# Altium schematic symbol library SCHLIB.SchLib: 2608 symbols (part 2 of 20) (continued)
## CON-3POS-2.5MM-RA (continued)
CONN HEADER 3POS 2.5MM R/A TIN; Manufacturer: Molex; Manufacturer Part Number: 0022057035; Gender: Male; Contact Resistance: 20mR; Number of Positions: 3; Max Voltage Rating (DC): 250V; Connector Type: Male Pin; Washability: OK; Supplier 1: Digi-Key; Stock 1: 10713; Pricing 1: 1=0.56, 10=0.527, 100=0.4037, 500=0.351, 1000=0.28958, 5000=0.25448, 10000=0.23693 (USD); Colour: Natural; Contact Plating: Copper,Tin; Contact Material: Brass; Housing Colour: Natural; Housing Material: Nylon; Min Operating Temperature: -40°C; Max Operating Temperature: 105°C; Packaging: Bulk; Number of Rows: 1; Termination: Solder; Number of Contacts: 3; Max Voltage Rating (AC): 250V; Length: 9.9mm; Depth: 7.9mm; Contact Mating Length: 0.138inch; ComponentLink1URL: http://www.molex.com/webdocs/datasheets/pdf/en-us/0022057035_PCB_HEADERS.pdf; ComponentLink1Description: http://www.molex.com/webdocs/datasheets/pdf/en-us/0022057035_PCB_HEADERS.pdf; ComponentLink2URL: https://www.molex.com/pdm_docs/sd/022057035_sd.pdf; ComponentLink2Description: https://www.molex.com/pdm_docs/sd/022057035_sd.pdf; Supplier Part Number 1: WM18901-ND
pins: 1, 2, 3

## CON-3POS-2.5MM-SOW3
designator J?, comment 2,5MSF03
Lumberg 2.5 MSF Series, 2.5mm Pitch 3 Way 1 Row Straight PCB Header, Solder Termination, 5A; Voltage Rating: 160V; Number of Contacts: 3; Gender: Male; Pitch: 5mm; Washability: OK; Supplier 1: TME; Manufacturer: Lumberg; Manufacturer Part Number: 2,5MSF03; Stock 1: 554; Pricing 1: 3=0.25440, 25=0.17800, 100=0.15820, 250=0.13850 (USD); RoHS: Yes; Case/Package: Module; Contact Material: Brass,CuZn; Contact Plating: Tin; Color: Black; Housing Material: Polyamide; Min Operating Temperature: -40°C; Max Operating Temperature: 120°C; Number of Rows: 1; Current Rating: 5A; Packaging: Bulk; Max Current Rating: 5A; Termination: Solder; Max Voltage Rating (AC): 160V; Orientation: Straight; Length: 12.2mm; Height: 22.5mm; Width: 7.5mm; Depth: 7.5mm; ComponentLink1URL: https://datasheet.ciiva.com/11754/0900766b80fbfb97-11754066.pdf?src-supplier=RSComponents; ComponentLink1Description: https://datasheet.ciiva.com/11754/0900766b80fbfb97-11754066.pdf?src-supplier=RSComponents; ComponentLink2URL: https://datasheet.ciiva.com/29195/732809-da-01-ml-stiftleiste-2-5-msf03-de-en-fr-29195855.pdf?src-supplier=Conrad; ComponentLink2Description: https://datasheet.ciiva.com/29195/732809-da-01-ml-stiftleiste-2-5-msf03-de-en-fr-29195855.pdf?src-supplier=Conrad; Supplier Part Number 1: 2.5MSF03
footprint 2.5 MSF 03
pins: 1, 2, 3

## CON-3POS-2.5MM-VERT
designator J?  Orientation: VRT  Mount: TH  Pitch: 2.5mm  (hidden comment: *)
CONN HEADER 3POS 2.5MM VERT TIN; Manufacturer: Molex; Number of Contacts: 3; Gender: Male; Current Rating: 3A; Contact Resistance: 20mR; Insulation Resistance: 1GR; Voltage Rating: 250V; Shrouded: Yes (With); Test Voltage: 1kV; Glow Wire Compliant: Non-compliant; Washability: OK; Supplier 1: Digi-Key; Manufacturer Part Number: 22-03-5035; Stock 1: 24555; Pricing 1: 1=0.53, 10=0.497, 100=0.3811, 500=0.3314, 1000=0.27341, 5000=0.24027, 10000=0.2237 (USD); Contact Plating: Copper,Tin; Contact Material: Brass,Tin; Housing Material: Nylon; Min Operating Temperature: -40°C; Max Operating Temperature: 105°C; Number of Rows: 1; Packaging: Bulk; Termination: Solder; Number of Positions: 3; Voltage Rating (AC): 250V; Number of Poles: 3; Package Quantity: 25000; Contact Gender: Male; Working Voltage: 250V; Voltage Rating (DC): 250V; Number of Circuits: 3; Radiation Hardening: No; Lead Free: Lead Free; REACH SVHC: Unknown; Flammability Rating: UL94 V-0; ComponentLink1URL: http://uk.rs-online.com/webdocs/13c2/0900766b813c2d9b.pdf; ComponentLink1Description: http://uk.rs-online.com/webdocs/13c2/0900766b813c2d9b.pdf; ComponentLink2URL: http://www.farnell.com/datasheets/1762354.pdf; ComponentLink2Description: http://www.farnell.com/datasheets/1762354.pdf; ComponentLink3URL: http://www.mouser.com/ds/2/276/0022035035_PCB_HEADERS-158316.pdf; ComponentLink3Description: http://www.mouser.com/ds/2/276/0022035035_PCB_HEADERS-158316.pdf; Supplier Part Number 1: WM18887-ND
footprint CON-3POS 2.5MM VERT
pins: 1 GND_IN, 2, 3

## CON-3POS-2.54MM-HEADER
designator J?  Pitch: 2.54mm  Mount: TH  (hidden comment: *)
CONN HEADER 3POS 2.54MM; Manufacturer: Wurth Electronics; Manufacturer Part Number: 61300311121; Number of Positions: 3; Gender: Male; Connector Type: Male Pin; Washability: OK; Supplier 1: Digi-Key; Stock 1: 178007; Pricing 1: 1=0.13, 10=0.106, 25=0.088, 50=0.074, 100=0.067, 1000=0.061 (USD); Contact Plating: Gold; Contact Material: Copper; Colour: Black; Number of Rows: 1; Packaging: Bulk; Termination: Solder; Number of Contacts: 3; Contact Mating Length: 0.236inch; REACH SVHC: Unknown; Lead Free: Lead Free; Supplier Part Number 1: 732-5316-ND
pins: 1 GND_IN, 2, 3

## CON-3POS-2MM-SMD
designator J?, comment 2MM
CONN HEADER SMD 3POS 2MM; Manufacturer: JST; Manufacturer Part Number: B3B-PH-SM4-TB(LF)(SN); Number of Positions: 3; Connector Type: Male Pin; Contact Resistance: 20mR; Current Rating: 2A; Voltage Rating (AC): 100V; Insulation Resistance: 1GR; Gender: Male; Washability: OK; Supplier 1: Digi-Key; Supplier Part Number 1: 455-1735-2-ND; Stock 1: 36000; Pricing 1: 1000=0.29721, 2000=0.28821, 3000=0.27019, 5000=0.26118, 10000=0.24317, 25000=0.23417 (USD); RoHS: Yes; Mount: Surface Mount; Color: Natural,White; Contact Plating: Tin,Copper; Contact Material: Copper Alloy,Tin,Bronze,Brass; Housing Color: Beige; Housing Material: Polyamide; Min Operating Temperature: -25°C; Max Operating Temperature: 85°C; Number of Rows: 1; Packaging: Tape and Reel; Termination: Solder; Max Current Rating: 2A; Number of Poles: 3; Voltage Rating: 100V; Fastening Type: Detent; Max Voltage Rating (AC): 100V; Number of Contacts: 3; Max Voltage Rating (DC): 100V; Working Voltage: 100V; Orientation: Straight; Length: 9.95mm; Height: 9.4mm; Pitch: 2mm; Lead Pitch: 2mm; Width: 5.5mm; Contact Mating Length: 0.13inch; Depth: 5mm; Lead Free: Lead Free; REACH SVHC: No SVHC; Flammability Rating: UL94 V-0; ComponentLink1URL: https://datasheet.ciiva.com/11747/0900766b80ddea81-11747684.pdf?src-supplier=RSComponents; ComponentLink1Description: https://datasheet.ciiva.com/11747/0900766b80ddea81-11747684.pdf?src-supplier=RSComponents
footprint CON-3POS-2MM-SMD
pins: 1 GND_IN, 2, 3

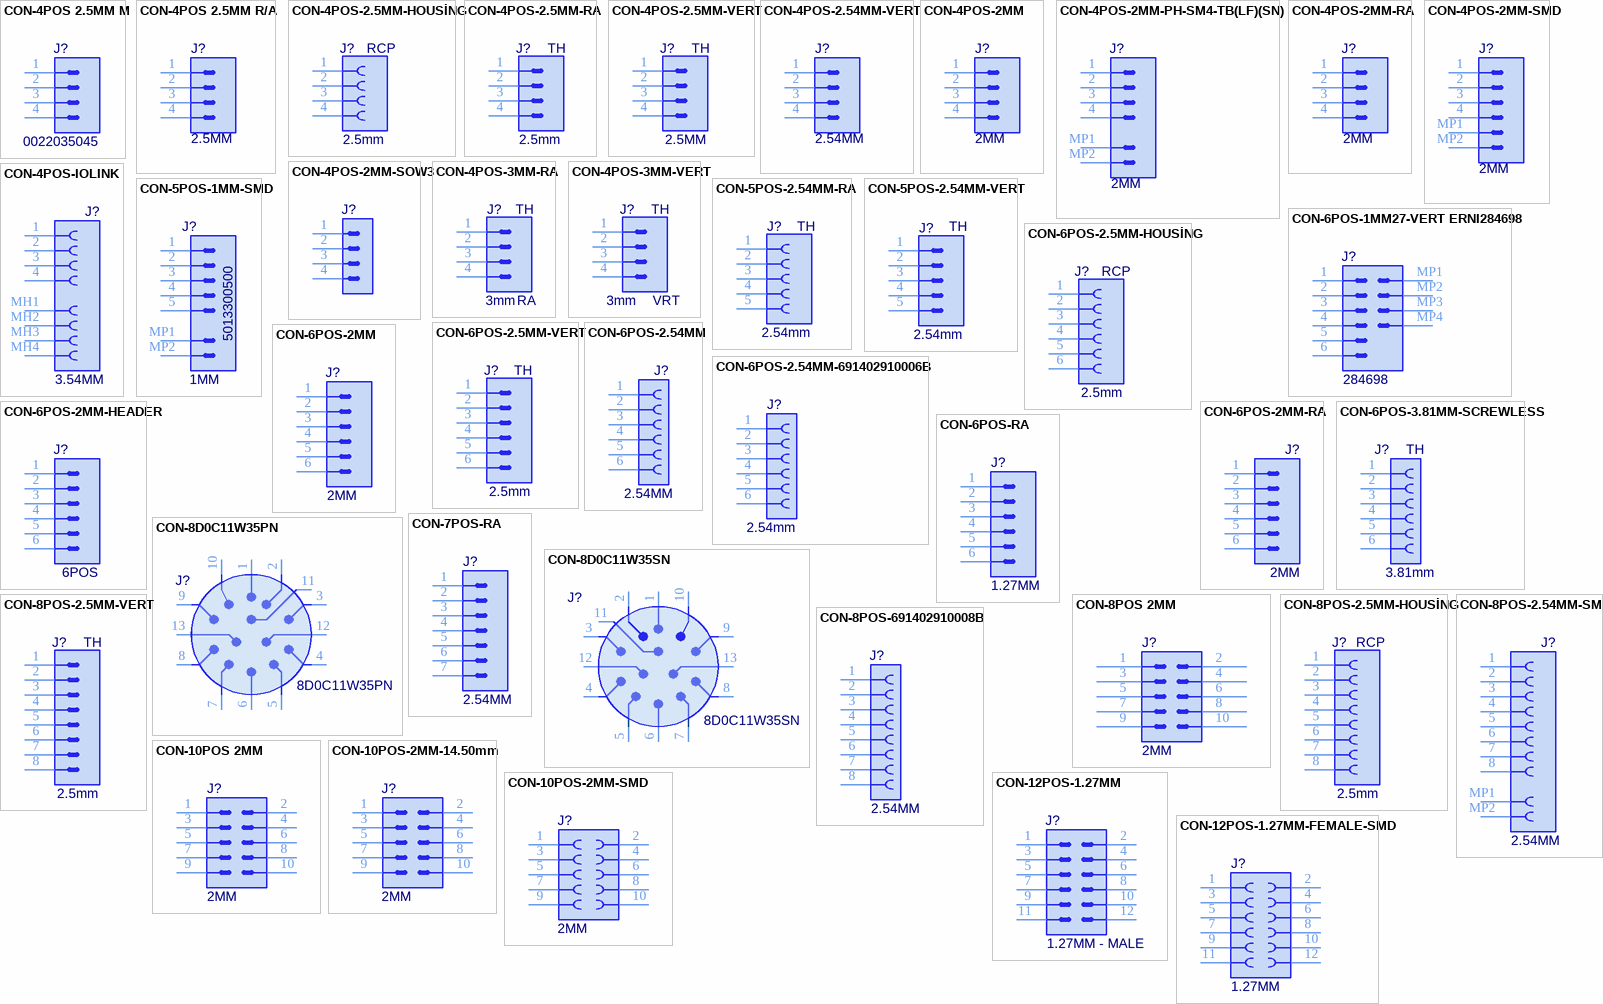
[diagram p6: symbols CON-4POS 2.5MM M to CON-12POS-1.27MM-FEMALE-SMD]

## CON-4POS 2.5MM M
designator J?, comment 0022035045
CONN HEADER VERT 4POS 2.5MM; Manufacturer: Molex; Number of Positions: 4; Gender: Male; Current Rating: 3A; Voltage Rating: 250V; Contact Resistance: 20mR; Insulation Resistance: 1GR; Test Voltage: 1kV; Washability: OK; Supplier 1: Digi-Key; Manufacturer Part Number: 22-03-5045; Stock 1: 28354; Pricing 1: 1=0,66000, 10=0,61400, 100=0,47100, 500=0,40960, 1000=0,33792, 5000=0,29696, 10000=0,27648 (USD); RoHS: Yes; Mount: Through Hole; Housing Material: Nylon; Contact Plating: Tin; Contact Material: Brass; Material: Nylon; Min Operating Temperature: -40°C; Max Operating Temperature: 105°C; Packaging: Bulk; Termination: Through Hole; Number of Rows: 1; Number of Contacts: 4; Package Quantity: 12000; Orientation: Straight; Contact Gender: Male; Number of Poles: 4; Voltage Rating (DC): 250V; Pitch: 2.5mm; Radiation Hardening: No; Lead Free: Lead Free; REACH SVHC: Unknown; Flammability Rating: UL94 V-0; ComponentLink1URL: https://datasheet.ciiva.com/30140/59000022035045-pcb-headers-30140706.pdf?src-supplier=Onlinecomponents.com; ComponentLink1Description: https://datasheet.ciiva.com/30140/59000022035045-pcb-headers-30140706.pdf?src-supplier=Onlinecomponents.com; ComponentLink2URL: https://datasheet.ciiva.com/11746/0900766b80da772c-11746677.pdf?src-supplier=RSComponents; ComponentLink2Description: https://datasheet.ciiva.com/11746/0900766b80da772c-11746677.pdf?src-supplier=RSComponents; ComponentLink3URL: https://datasheet.ciiva.com/5157/0022035045-pcb-headers-132183-5157848.pdf?src-supplier=Mouser; ComponentLink3Description: https://datasheet.ciiva.com/5157/0022035045-pcb-headers-132183-5157848.pdf?src-supplier=Mouser; ComponentLink4URL: https://datasheet.ciiva.com/27054/1930699-27054941.pdf?src-supplier=Jameco; ComponentLink4Description: https://datasheet.ciiva.com/27054/1930699-27054941.pdf?src-supplier=Jameco; ComponentLink5URL: https://datasheet.ciiva.com/25908/0022035045-pcb-headers-25908182.pdf?src-supplier=Avnet+Europe; ComponentLink5Description: https://datasheet.ciiva.com/25908/0022035045-pcb-headers-25908182.pdf?src-supplier=Avnet+Europe; ComponentLink6URL: https://datasheet.ciiva.com/9468/0022035045-pcb-headers-9468375.pdf?src-supplier=Avnet; ComponentLink6Description: https://datasheet.ciiva.com/9468/0022035045-pcb-headers-9468375.pdf?src-supplier=Avnet; ComponentLink7URL: https://datasheet.ciiva.com/7843/1864671-7843917.pdf?src-supplier=Element14; ComponentLink7Description: https://datasheet.ciiva.com/7843/1864671-7843917.pdf?src-supplier=Element14; Supplier Part Number 1: WM18888-ND
footprint CON-22035045
pins: 1 GND_IN, 2, 3, 4

## CON-4POS 2.5MM R/A
designator J?, comment 2.5MM
CONN HEADER R/A 4POS 2.5MM; Manufacturer 1: JST; Manufacturer Part Number 1: S4B-XH-A(LF)(SN); Current Rating: 3A; Voltage Rating: 250V; Contact Resistance: 20mR; Number of Positions: 4; Insulation Resistance: 1GR; Gender: Male; Connector Type: Male Pin; Wire/Cable Gauge: 22AWG; Washability: OK; Supplier 1: Digi-Key; Stock 1: 37754; Pricing 1: 1=0,27000, 10=0,25700, 100=0,17850, 500=0,15100, 1000=0,12355, 5000=0,10982, 10000=0,09953 (USD); RoHS: Yes; Mount: Through Hole; Color: Natural; Contact Material: Brass; Contact Plating: Tin; Housing Color: White; Housing Material: Polyamide; Min Operating Temperature: -25°C; Max Operating Temperature: 85°C; Package Quantity: 500; Number of Rows: 1; Packaging: Bulk; Voltage Rating (AC): 250V; Max Current Rating: 3A; Termination: Press-Fit; Number of Contacts: 4; Max Voltage Rating (AC): 250V; Orientation: Right Angle; Length: 12.4mm; Lead Pitch: 2.5mm; Pitch: 2.5mm; Depth: 11.5mm; REACH SVHC: No SVHC; Lead Free: Lead Free; ComponentLink1URL: https://datasheet.ciiva.com/726/exh-726400.pdf?src-supplier=Digi-Key; ComponentLink1Description: https://datasheet.ciiva.com/726/exh-726400.pdf?src-supplier=Digi-Key; ComponentLink2URL: https://datasheet.ciiva.com/26924/getdatasheetpartid-449045-26924078.pdf?src-supplier=Verical; ComponentLink2Description: https://datasheet.ciiva.com/26924/getdatasheetpartid-449045-26924078.pdf?src-supplier=Verical; ComponentLink3URL: https://datasheet.ciiva.com/8052/5448-8052236.pdf?src-supplier=Element14; ComponentLink3Description: https://datasheet.ciiva.com/8052/5448-8052236.pdf?src-supplier=Element14; Supplier Part Number 1: 455-2243-ND
footprint CON-4POS-2.5MM-R/A (CONN HEADER R/A 4POS 2.5MM)
pins: 1 GND_IN, 2, 3, 4

## CON-4POS-2.5MM-HOUSİNG
designator J?  Gender: RCP  Pitch: 2.5mm  (hidden comment: *)
CONN HOUSING 4POS 2.5MM SHROUD; Manufacturer: Molex; Body Material: Nylon,Polyamide; Connector Type: Power,Rectangular; Number of Positions: 4; Current Rating: 3A; Voltage Rating (AC): 250V; Shrouded: Yes (With); Test Voltage: 1kV; Insulation Resistance: 1GR; Approvals: CSA,UL; Glow Wire Compliant: Non-compliant; Washability: OK; Supplier 1: Digi-Key; Manufacturer Part Number: 50-37-5043; Stock 1: 6605; Pricing 1: 1=0.42, 10=0.393, 25=0.3368, 50=0.2864, 100=0.2751, 250=0.24708, 500=0.23584, 1000=0.19653, 2500=0.17968 (USD); Mount: Cable,PCB; Housing Material: Polyamide; Material: Nylon,Polyamide; Min Operating Temperature: -40°C; Max Operating Temperature: 105°C; Number of Rows: 1; Packaging: Bulk; Termination: Crimp; Number of Contacts: 4; Orientation: Straight; Number of Poles: 4; Contact Gender: Female; Package Quantity: 4000; Working Voltage: 250V; Length: 12.4mm; Height: 8mm; Depth: 8mm; Width: 3.9mm; Radiation Hardening: No; REACH SVHC: Unknown; Lead Free: Lead Free; Halogen Free: Low Halogen; Flammability Rating: UL94 V-0; ComponentLink1URL: http://www.onlinecomponents.com/productFiles/mf-MOL/377140050375043_crimp_housings.pdf; ComponentLink1Description: http://www.onlinecomponents.com/productFiles/mf-MOL/377140050375043_crimp_housings.pdf; ComponentLink2URL: http://www.molex.com/webdocs/datasheets/pdf/en-us/0050375043_CRIMP_HOUSINGS.pdf; ComponentLink2Description: http://www.molex.com/webdocs/datasheets/pdf/en-us/0050375043_CRIMP_HOUSINGS.pdf; ComponentLink3URL: http://www.farnell.com/datasheets/2035857.pdf; ComponentLink3Description: http://www.farnell.com/datasheets/2035857.pdf; ComponentLink4URL: http://www.mouser.com/ds/2/276/0050375043_CRIMP_HOUSINGS-137285.pdf; ComponentLink4Description: http://www.mouser.com/ds/2/276/0050375043_CRIMP_HOUSINGS-137285.pdf; Supplier Part Number 1: WM17405-ND
pins: 1 GND_IN, 2, 3, 4

## CON-4POS-2.5MM-RA
designator J?  Pitch: 2.5mm  Mount: TH  (hidden comment: *)
CONN HEADER 4POS 2.5MM R/A TIN; Manufacturer: Molex; Number of Contacts: 4; Current Rating: 3A; Contact Resistance: 20mR; Gender: Male; Insulation Resistance: 1GR; Connector Type: Male Pin; Voltage Rating: 250V; Max Voltage Rating (DC): 250.25kV; Shrouded: Yes (With); Test Voltage: 1kV; Glow Wire Compliant: Non-compliant; Washability: OK; Supplier 1: Digi-Key; Manufacturer Part Number: 22-05-7045; Stock 1: 9776; Pricing 1: 1=0.75, 10=0.66, 100=0.5698, 500=0.4662, 1000=0.4144, 5000=0.3626, 10000=0.34447 (USD); Contact Plating: Copper,Tin; Contact Material: Brass,Tin; Housing Material: Nylon; Housing Colour: Natural; Colour: Natural; Material: Nylon,Polyamide; Min Operating Temperature: -40°C; Max Operating Temperature: 105°C; Number of Rows: 1; Termination: Solder; Orientation: Right Angle; Packaging: Bulk; Package Quantity: 1; Number of Positions: 4; Voltage Rating (DC): 250V; Number of Circuits: 4; Contact Gender: Male; Number of Poles: 4; Voltage Rating (AC): 250V; Working Voltage: 250V; Lead Pitch: 2.5mm; Contact Mating Length: 0.138inch; Radiation Hardening: No; Lead Free: Lead Free; Flammability Rating: UL94 V-0; REACH SVHC: Unknown; ComponentLink1URL: http://uk.rs-online.com/webdocs/13c2/0900766b813c2df4.pdf; ComponentLink1Description: http://uk.rs-online.com/webdocs/13c2/0900766b813c2df4.pdf; ComponentLink2URL: http://www.farnell.com/datasheets/1626532.pdf; ComponentLink2Description: http://www.farnell.com/datasheets/1626532.pdf; ComponentLink3URL: http://www.mouser.com/ds/2/276/0022057045_PCB_HEADERS-158482.pdf; ComponentLink3Description: http://www.mouser.com/ds/2/276/0022057045_PCB_HEADERS-158482.pdf; ComponentLink4URL: http://www.molex.com/webdocs/datasheets/pdf/en-us/0022057045_PCB_HEADERS.pdf; ComponentLink4Description: http://www.molex.com/webdocs/datasheets/pdf/en-us/0022057045_PCB_HEADERS.pdf; ComponentLink5URL: https://www.molex.com/pdm_docs/sd/022057045_sd.pdf; ComponentLink5Description: https://www.molex.com/pdm_docs/sd/022057045_sd.pdf; Supplier Part Number 1: WM18902-ND
pins: 1 GND_IN, 2, 3, 4

## CON-4POS-2.5MM-VERT
designator J?, comment 2.5MM  Mount: TH
CONN HEADER 4POS 2.5MM VERT TIN; Manufacturer: Molex; Contact Resistance: 20mR; Number of Positions: 4; Current Rating: 3A; Voltage Rating: 250V; Gender: Male; Insulation Resistance: 1GR; Test Voltage: 1kV; Washability: OK; Supplier 1: Digi-Key; Manufacturer Part Number: 22-03-5045; Stock 1: 15410; Pricing 1: 1=0.66, 10=0.614, 100=0.471, 500=0.4096, 1000=0.33792, 5000=0.29696, 10000=0.27648 (USD); Contact Plating: Copper,Tin; Contact Material: Brass,Tin; Housing Material: Nylon; Material: Nylon; Min Operating Temperature: -40°C; Max Operating Temperature: 105°C; Number of Rows: 1; Packaging: Bulk; Termination: Through Hole; Number of Contacts: 4; Orientation: Straight; Package Quantity: 12000; Number of Poles: 4; Voltage Rating (DC): 250V; Contact Gender: Male; Radiation Hardening: No; REACH SVHC: Unknown; Lead Free: Lead Free; Flammability Rating: UL94 V-0; ComponentLink1URL: http://uk.rs-online.com/webdocs/13c2/0900766b813c2d9c.pdf; ComponentLink1Description: http://uk.rs-online.com/webdocs/13c2/0900766b813c2d9c.pdf; ComponentLink2URL: http://www.molex.com/webdocs/datasheets/pdf/en-us/0022035045_PCB_HEADERS.pdf; ComponentLink2Description: http://www.molex.com/webdocs/datasheets/pdf/en-us/0022035045_PCB_HEADERS.pdf; ComponentLink3URL: http://www.mouser.com/ds/2/276/0022035045_PCB_HEADERS-132183.pdf; ComponentLink3Description: http://www.mouser.com/ds/2/276/0022035045_PCB_HEADERS-132183.pdf; ComponentLink4URL: http://www.farnell.com/datasheets/2035383.pdf; ComponentLink4Description: http://www.farnell.com/datasheets/2035383.pdf; ComponentLink5URL: http://www.jameco.com/Jameco/Products/ProdDS/1930699.pdf; ComponentLink5Description: http://www.jameco.com/Jameco/Products/ProdDS/1930699.pdf; Supplier Part Number 1: WM18888-ND; Pitch: 2.5mm
footprint CON-4POS-2.5MM-VERT
pins: 1 GND_IN, 2, 3, 4

## CON-4POS-2.54MM-VERT
designator J?, comment 2.54MM
CONN HEADER VERT 4POS 2.5MM; Manufacturer Part Number: B4B-XH-A(LF)(SN); Manufacturer: JST; Current Rating: 3A; Contact Resistance: 20mR; Voltage Rating (AC): 250V; Number of Positions: 4; Insulation Resistance: 1GR; Connector Type: Male Pin; Gender: Male; Wire/Cable Gauge: 22AWG; Washability: OK; Supplier 1: Digi-Key; Supplier Part Number 1: 455-2249-ND; Stock 1: 216256; Pricing 1: 1=0.21, 10=0.194, 100=0.1348, 500=0.11406, 1000=0.09333, 5000=0.08296, 10000=0.07518 (USD); Mount: Through Hole; Contact Material: Brass; Contact Plating: Copper,Lead,Tin; Color: Natural; Housing Color: White; Housing Material: Polyamide; Material: Polyamide; Min Operating Temperature: -25°C; Max Operating Temperature: 85°C; Number of Rows: 1; Max Current Rating: 3A; Package Quantity: 500; Packaging: Bulk; Voltage Rating: 250V; Termination: Press-Fit; Max Voltage Rating (AC): 250V; Max Voltage Rating (DC): 250V; Number of Contacts: 4; Orientation: Straight; Length: 12.4mm; Pitch: 2.5mm; Lead Pitch: 2.5mm; Depth: 5.75mm; REACH SVHC: No SVHC; Lead Free: Lead Free; ComponentLink1URL: https://www.verical.com/server-webapp/html/getDatasheet?partID=455616&src-supplier=Verical; ComponentLink1Description: https://www.verical.com/server-webapp/html/getDatasheet?partID=455616&src-supplier=Verical; ComponentLink2URL: https://www.verical.com/server-webapp/html/getDatasheet?partID=640571&src-supplier=Verical; ComponentLink2Description: https://www.verical.com/server-webapp/html/getDatasheet?partID=640571&src-supplier=Verical; ComponentLink3URL: http://www.jst-mfg.com/product/pdf/eng/eXH.pdf?src-supplier=Digi-Key; ComponentLink3Description: http://www.jst-mfg.com/product/pdf/eng/eXH.pdf?src-supplier=Digi-Key; ComponentLink4URL: http://www.jst-mfg.com/product/pdf/eng/eXH.pdf?src-supplier=Future+Electronics; ComponentLink4Description: http://www.jst-mfg.com/product/pdf/eng/eXH.pdf?src-supplier=Future+Electronics
footprint CON-4POS-2.54MM (2.54 mm (100mil))
pins: 1 GND_IN, 2, 3, 4

## CON-4POS-2MM
designator J?, comment 2MM
CONN HEADER VERT 4POS 2MM; Manufacturer: TE Connectivity; Manufacturer Part Number: 1735446-4; Number of Positions: 4; Connector Type: Header,Pin,Plug; Mating Retention: Yes (With); Sealable: No (Without); Contact Current Rating: 3A; Wire/Cable Type: Discrete; Connector System: Wire-to-Board; Plating Thickness: 2.03um; Pitch: 0.079inch; Wire/Cable Gauge: 30AWG; PCB Thickness: 1.6mm; Tail Length: 3.4mm; Contact Post Length: 0.134inch; Washability: OK; Supplier 1: Digi-Key; Stock 1: 66082; Pricing 1: 1=0.14, 10=0.131, 100=0.0808, 500=0.06688, 1000=0.05851, 5000=0.05016, 10000=0.04876 (USD); Mount: Through Hole; Color: Natural; Contact Material: Copper Alloy; Housing Color: Natural; Housing Material: Thermoplastic; Contact Plating: Bright,Tin; Contact Shape: Square; Min Operating Temperature: -13°C; Max Operating Temperature: 185°C; Number of Rows: 1; Package Quantity: 500; Packaging: Bag; Contact Gender: Male; Termination: Through Hole; Number of Contacts: 4; Orientation: Straight; Strain Relief: No (Without); Backwall/Post Interruptions: No (Without); Contact Retention: No (Without); PCB Mount Alignment: No (Without); Selectively Loaded: No (Without); Length: 10mm; Height: 0.239inch; Width: 0.185inch; Contact Mating Length: 0.132inch; Radiation Hardening: No; Flammability Rating: UL94 V-0; REACH SVHC: Unknown; ComponentLink1URL: http://www.onlinecomponents.com/productFiles/mf-AMP/pgurl_1735446-4.pdf?src-supplier=Onlinecomponents.com; ComponentLink1Description: http://www.onlinecomponents.com/productFiles/mf-AMP/pgurl_1735446-4.pdf?src-supplier=Onlinecomponents.com; ComponentLink2URL: https://www.te.com/commerce/DocumentDelivery/DDEController?Action=srchrtrv&DocNm=1735446&DocType=Customer+Drawing&DocLang=English&src-supplier=Digi-Key; ComponentLink2Description: https://www.te.com/commerce/DocumentDelivery/DDEController?Action=srchrtrv&DocNm=1735446&DocType=Customer+Drawing&DocLang=English&src-supplier=Digi-Key; Supplier Part Number 1: A100098-ND
footprint CON-4POS-2MM-VERT
pins: 1 GND_IN, 2, 3, 4

## CON-4POS-2MM-PH-SM4-TB(LF)(SN)
designator J?, comment 2MM
CONN HEADER SMD R/A 4POS 2MM; Manufacturer 1: JST; Manufacturer Part Number 1: S4B-PH-SM4-TB(LF)(SN); Current Rating: 2A; Voltage Rating: 100V; Number of Positions: 4; Insulation Resistance: 1GR; Gender: Male; Contact Resistance: 20mR; Washability: OK; Supplier 1: Arrow; Stock 1: 109400; Pricing 1: 1000=0,26000, 2000=0,25260, 3000=0,24080, 5000=0,23360, 10000=0,22180, 25000=0,19960 (USD); RoHS: Yes; Mount: Surface Mount; Color: Natural; Contact Material: Copper Alloy; Contact Plating: Tin; Housing Color: Beige; Housing Material: Polyamide; Contact Shape: Square; Insulation Material: Nylon; Insulation Color: Natural; Min Operating Temperature: -25°C; Max Operating Temperature: 85°C; Number of Rows: 1; Packaging: Tape and Reel; Voltage Rating (AC): 100V; Termination: Solder; Number of Contacts: 4; Orientation: Right Angle; Number of Poles: 4; Max Current Rating: 2A; Fastening Type: Detent; Working Voltage: 100V; Max Voltage Rating (AC): 100V; Max Voltage Rating (DC): 100V; Connector Type: Header; Length: 11.9mm; Height: 9.4mm; Width: 5mm; Pitch: 2mm; Lead Pitch: 2mm; Contact Mating Length: 0.13inch; Depth: 7.6mm; Lead Free: Lead Free; REACH SVHC: No SVHC; Flammability Rating: UL94 V-0; ComponentLink1URL: https://datasheet.ciiva.com/11746/0900766b80df0d9d-11746552.pdf?src-supplier=RSComponents; ComponentLink1Description: https://datasheet.ciiva.com/11746/0900766b80df0d9d-11746552.pdf?src-supplier=RSComponents; ComponentLink2URL: https://datasheet.ciiva.com/712/eph-712578.pdf?src-supplier=Digi-Key; ComponentLink2Description: https://datasheet.ciiva.com/712/eph-712578.pdf?src-supplier=Digi-Key; ComponentLink3URL: https://datasheet.ciiva.com/712/eph-712579.pdf?src-supplier=Digi-Key; ComponentLink3Description: https://datasheet.ciiva.com/712/eph-712579.pdf?src-supplier=Digi-Key; ComponentLink4URL: https://datasheet.ciiva.com/730/eph-730675.pdf?src-supplier=Digi-Key; ComponentLink4Description: https://datasheet.ciiva.com/730/eph-730675.pdf?src-supplier=Digi-Key; ComponentLink5URL: https://datasheet.ciiva.com/8052/1699381-8052234.pdf?src-supplier=Element14; ComponentLink5Description: https://datasheet.ciiva.com/8052/1699381-8052234.pdf?src-supplier=Element14; ComponentLink6URL: https://datasheet.ciiva.com/26894/getdatasheetpartid-639990-26894620.pdf?src-supplier=Verical; ComponentLink6Description: https://datasheet.ciiva.com/26894/getdatasheetpartid-639990-26894620.pdf?src-supplier=Verical; ComponentLink7URL: https://datasheet.ciiva.com/16376/eph-16376783.pdf?src-supplier=Future+Electronics; ComponentLink7Description: https://datasheet.ciiva.com/16376/eph-16376783.pdf?src-supplier=Future+Electronics; Supplier Part Number 1: S4B-PH-SM4-TB (LF)(SN)
footprint CON-4POS-2MM-R/A (CONN HEADER SMD R/A 4POS 2MM)
pins: 1 GND_IN, 2, 3, 4, MP1 GND_IN, MP2 GND_IN

## CON-4POS-2MM-RA
designator J?, comment 2MM
CONN HEADER R/A 4POS 2MM; Manufacturer: JST; Manufacturer Part Number: S4B-PH-K-S(LF)(SN); Voltage Rating: 100V; Number of Poles: 4; Contact Resistance: 10mR; Current Rating: 2A; Insulation Resistance: 1GR; Gender: Male; Connector Type: Male Pin; Washability: OK; Supplier 1: Digi-Key; Supplier Part Number 1: 455-1721-ND; Stock 1: 350055; Pricing 1: 1=0.22, 10=0.208, 100=0.144, 500=0.12186, 1000=0.0997, 5000=0.08862, 10000=0.08031 (USD); Mount: Through Hole; Number of Pins: 4; Contact Material: Brass,Bronze,Tin; Contact Plating: Tin; Color: Natural,White; Housing Color: Natural; Min Operating Temperature: -25°C; Max Operating Temperature: 85°C; Packaging: Bulk; Termination: Solder; Number of Rows: 1; Voltage Rating (AC): 100V; Number of Positions: 4; Fastening Type: Detent; Number of Contacts: 4; Working Voltage: 100V; Orientation: Right Angle; Length: 9.9mm; Height: 9.4mm; Width: 4.5mm; Lead Pitch: 2mm; Pitch: 2mm; Contact Mating Length: 0.13inch; Lead Free: Lead Free; REACH SVHC: No SVHC; Flammability Rating: UL94 V-0; ComponentLink1URL: http://www.jst-mfg.com/product/pdf/eng/ePH.pdf?src-supplier=Digi-Key; ComponentLink1Description: http://www.jst-mfg.com/product/pdf/eng/ePH.pdf?src-supplier=Digi-Key
footprint CON-4POS-2MM-RA
pins: 1 GND_IN, 2, 3, 4

## CON-4POS-2MM-SMD
designator J?, comment 2MM
CONN HEADER SMD 4POS 2MM; Manufacturer: JST; Manufacturer Part Number: B4B-PH-SM4-TB(LF)(SN); Number of Positions: 4; Connector Type: Male Pin; Contact Resistance: 20mR; Current Rating: 2A; Voltage Rating (AC): 100V; Insulation Resistance: 1GR; Gender: Male; Washability: OK; Supplier 1: Digi-Key; Supplier Part Number 1: 455-1736-6-ND; Stock 1: 141980; Pricing 1: 1=0.8, 10=0.75, 100=0.5751, 500=0.50006 (USD); Mount: Surface Mount; Contact Plating: Copper,Tin; Color: Natural,White; Contact Material: Brass,Bronze,Copper Alloy,Tin; Housing Color: Beige; Housing Material: Polyamide; Min Operating Temperature: -25°C; Max Operating Temperature: 85°C; Number of Rows: 1; Packaging: Tape and Reel; Voltage Rating: 100V; Max Current Rating: 2A; Number of Poles: 4; Termination: Solder; Fastening Type: Detent; Number of Contacts: 4; Max Voltage Rating (AC): 100V; Working Voltage: 100V; Orientation: Straight; Length: 11.95mm; Height: 9.4mm; Pitch: 2mm; Lead Pitch: 2mm; Width: 5.5mm; Contact Mating Length: 0.13inch; Depth: 5mm; Lead Free: Lead Free; REACH SVHC: No SVHC; Flammability Rating: UL94 V-0; ComponentLink1URL: http://www.farnell.com/datasheets/1699381.pdf?src-supplier=Element14; ComponentLink1Description: http://www.farnell.com/datasheets/1699381.pdf?src-supplier=Element14; ComponentLink2URL: http://uk.rs-online.com/webdocs/13ce/0900766b813ce4ba.pdf?src-supplier=RSComponents; ComponentLink2Description: http://uk.rs-online.com/webdocs/13ce/0900766b813ce4ba.pdf?src-supplier=RSComponents; ComponentLink3URL: http://www.farnell.com/datasheets/1699381.pdf?src-supplier=Newark; ComponentLink3Description: http://www.farnell.com/datasheets/1699381.pdf?src-supplier=Newark; ComponentLink4URL: http://www.jst-mfg.com/product/pdf/eng/ePH.pdf?src-supplier=Digi-Key; ComponentLink4Description: http://www.jst-mfg.com/product/pdf/eng/ePH.pdf?src-supplier=Digi-Key
pins: 1 GND_IN, 2, 3, 4, MP1, MP2

## CON-4POS-2MM-SOW3
designator J?, comment B4B-PH-K-S(LF)(SN)  (value not drawn)
CONN HEADER VERT 4POS 2MM; Manufacturer: JST; Voltage Rating: 100V; Current Rating: 2A; Contact Resistance: 20mR; Number of Poles: 4; Insulation Resistance: 1MR; Gender: Male; Connector Type: Male Pin; Washability: OK; Supplier 1: Digi-Key; Manufacturer Part Number: B4B-PH-K-S(LF)(SN); Stock 1: 16457; Pricing 1: 1=0.240000, 10=0.227000, 100=0.157300, 500=0.133120, 1000=0.108920, 5000=0.096820, 10000=0.087740 (USD); RoHS: Yes; Mount: Through Hole; Number of Pins: 4; Contact Material: Brass,Tin; Contact Plating: Tin,Copper; Color: Natural; Housing Color: White; Housing Material: Polyamide; Material: Polyamide; Min Operating Temperature: -25°C; Max Operating Temperature: 85°C; Packaging: Bulk; Termination: Solder; Number of Rows: 1; Max Current Rating: 2A; Voltage Rating (AC): 100V; Number of Positions: 4; Fastening Type: Detent; Number of Contacts: 4; Max Voltage Rating (AC): 100V; Max Voltage Rating (DC): 100V; Working Voltage: 100V; Orientation: Straight; Length: 9.9mm; Height: 9.4mm; Width: 4.5mm; Depth: 4.5mm; Lead Pitch: 2mm; Pitch: 2mm; Contact Mating Length: 0.13inch; Lead Free: Lead Free; REACH SVHC: No SVHC; ComponentLink1URL: https://datasheet.ciiva.com/11747/0900766b8082f552-11747200.pdf?src-supplier=RSComponents; ComponentLink1Description: https://datasheet.ciiva.com/11747/0900766b8082f552-11747200.pdf?src-supplier=RSComponents; ComponentLink2URL: https://datasheet.ciiva.com/712/eph-712488.pdf?src-supplier=Digi-Key; ComponentLink2Description: https://datasheet.ciiva.com/712/eph-712488.pdf?src-supplier=Digi-Key; ComponentLink3URL: https://datasheet.ciiva.com/16209/eph-16209245.pdf?src-supplier=Future+Electronics; ComponentLink3Description: https://datasheet.ciiva.com/16209/eph-16209245.pdf?src-supplier=Future+Electronics; ComponentLink4URL: https://datasheet.ciiva.com/43491/741223-da-01-en-stiftleiste-gerade-4-pol-rm2-0-43491964.pdf?src-supplier=Conrad; ComponentLink4Description: https://datasheet.ciiva.com/43491/741223-da-01-en-stiftleiste-gerade-4-pol-rm2-0-43491964.pdf?src-supplier=Conrad; Supplier Part Number 1: 455-1706-ND
footprint JST-B4B-PH-K-S_V (Connector, 4-Leads, Body 9.9x4.5mm, Pitch 2mm)
pins: 1, 2, 3, 4

## CON-4POS-3MM-RA
designator J?  Mount: TH  Orientation: RA  Lead Pitch: 3mm  (hidden comment: *)
CONN HEADER 4POS 3MM RT ANG TIN; Manufacturer: Molex; Manufacturer Part Number: 43045-0400; Number of Positions: 4; Current Rating: 5A; Voltage Rating (AC): 250V; Contact Resistance: 10mR; Gender: Male; Voltage Rating: 600V; Max Voltage Rating (DC): 250.25kV; Glow Wire Compliant: Compliant; Approvals: CSA,TUV,UL; Washability: OK; Supplier 1: Digi-Key; Stock 1: 22999; Pricing 1: 1=1.42, 10=1.289, 100=1.1052, 500=0.92102, 2232=0.76314, 6696=0.69998, 11160=0.68419 (USD); Case/Package: SMC; Contact Material: Brass,Tin; Contact Plating: Tin; Colour: Black; Housing Colour: Black; Material: Polyester; Housing Material: Thermoplastic; Min Operating Temperature: -40°C; Max Operating Temperature: 105°C; Number of Rows: 2; Number of Contacts: 4; Packaging: Tray; Termination: Solder; Number of Circuits: 4; Package Quantity: 2232; Number of Poles: 4; Contact Gender: Male; Working Voltage: 250V; Diameter: 3mm; Pitch: 3mm; Row Spacing: 3mm; Radiation Hardening: No; Flammability Rating: UL94 V-0; Halogen Free: Low Halogen; Lead Free: Lead Free; REACH SVHC: Unknown; ComponentLink1URL: http://www.mouser.com/ds/2/276/0430450400_PCB_HEADERS-168191.pdf; ComponentLink1Description: http://www.mouser.com/ds/2/276/0430450400_PCB_HEADERS-168191.pdf; ComponentLink2URL: http://www.molex.com/webdocs/datasheets/pdf/en-us/0430450400_PCB_HEADERS.pdf; ComponentLink2Description: http://www.molex.com/webdocs/datasheets/pdf/en-us/0430450400_PCB_HEADERS.pdf; ComponentLink3URL: http://www.rapidonline.com/pdf/22-3744e.pdf; ComponentLink3Description: http://www.rapidonline.com/pdf/22-3744e.pdf; ComponentLink4URL: http://www.farnell.com/datasheets/2153088.pdf; ComponentLink4Description: http://www.farnell.com/datasheets/2153088.pdf; ComponentLink5URL: http://uk.rs-online.com/webdocs/13c3/0900766b813c3a47.pdf; ComponentLink5Description: http://uk.rs-online.com/webdocs/13c3/0900766b813c3a47.pdf; ComponentLink6URL: https://www.alliedelec.com/m/d/e1d2fe0a53791775edaf6c29add04568.pdf; ComponentLink6Description: https://www.alliedelec.com/m/d/e1d2fe0a53791775edaf6c29add04568.pdf; Supplier Part Number 1: WM1814-ND
pins: 1 GND_IN, 2, 3, 4

## CON-4POS-3MM-VERT
designator J?  Orientation: VRT  Row Spacing: 3mm  Mount: TH  (hidden comment: *)
CONN HEADER 4POS 3MM VERT TIN; Manufacturer: Molex; Manufacturer Part Number: 43045-0412; Number of Positions: 4; Contact Resistance: 10mR; Max Voltage Rating (DC): 250.25kV; Current Rating: 5A; Gender: Male; Connector Type: Plug,Socket; Operating Supply Voltage: 250V; Glow Wire Compliant: Compliant; Approvals: CSA,TUV,UL; Washability: OK; Supplier 1: Digi-Key; Stock 1: 15048; Pricing 1: 1=1.26, 10=1.11, 100=0.9579, 500=0.78372, 2232=0.6531, 6696=0.60956, 11160=0.57908 (USD); Contact Material: Brass,Tin; Contact Plating: Tin; Colour: Black; Housing Colour: Black; Material: Polyester; Housing Material: Thermoplastic; Min Operating Temperature: -40°C; Max Operating Temperature: 105°C; Number of Rows: 2; Number of Contacts: 4; Packaging: Tray; Termination: Solder; Number of Circuits: 4; Voltage Rating: 250V; Max Current Rating: 5A; Package Quantity: 2232; Diameter: 3mm; Length: 10.15mm; Height: 9.91mm; Pitch: 3mm; Depth: 8.77mm; Radiation Hardening: No; Flammability Rating: UL94 V-0; Halogen Free: Low Halogen; Lead Free: Lead Free; REACH SVHC: Unknown; ComponentLink1URL: http://uk.rs-online.com/webdocs/13c3/0900766b813c3a54.pdf; ComponentLink1Description: http://uk.rs-online.com/webdocs/13c3/0900766b813c3a54.pdf; ComponentLink2URL: http://www.molex.com/webdocs/datasheets/pdf/en-us/0430450412_PCB_HEADERS.pdf; ComponentLink2Description: http://www.molex.com/webdocs/datasheets/pdf/en-us/0430450412_PCB_HEADERS.pdf; ComponentLink3URL: http://www.rapidonline.com/pdf/22-3730e.pdf; ComponentLink3Description: http://www.rapidonline.com/pdf/22-3730e.pdf; ComponentLink4URL: http://www.jameco.com/Jameco/Products/ProdDS/883368.pdf; ComponentLink4Description: http://www.jameco.com/Jameco/Products/ProdDS/883368.pdf; ComponentLink5URL: http://www.farnell.com/datasheets/1928349.pdf; ComponentLink5Description: http://www.farnell.com/datasheets/1928349.pdf; Supplier Part Number 1: WM1790-ND
pins: 1 GND_IN, 2, 3, 4

## CON-4POS-IOLINK
designator J?, comment 3.54MM
CONN PLUG FMALE 4POS GOLD SOLDER; Manufacturer: TE Connectivity; Manufacturer Part Number: T4145515041-001; Plating: Nickel; Connector Type: Receptacle,Socket; Connector System: Wire-to-Board; Mating Retention: Yes (With); Number of Positions: 4; Shielding: Unshielded; Supplier 1: Digi-Key; Supplier Part Number 1: A126539-ND; Stock: 398; Pricing: 1=7.15, 10=6.854, 25=6.258, 50=5.96, 100=5.662, 250=5.066, 500=4.768, 1000=4.172, 2500=3.9634 (USD); RoHS: No; Mount: Panel; Insulation Material: Polyamide; Shell Material: Brass; Min Operating Temperature: -40°C; Max Operating Temperature: 85°C; Number of Signal Positions: 4; Sealable: Yes (With)
footprint CON-4PIN-IOLINK
pins: 1 GND_IN, 2, 3, 4, MH1, MH2, MH3, MH4

## CON-5POS-1MM-SMD
designator J?, comment 1MM  Mating: 5013300500
CONN HEADER SMD 5POS 1MM; Manufacturer: Molex; Manufacturer Part Number: 501331-0507; Voltage Rating: 50V; Contact Resistance: 20mR; Max Voltage Rating (DC): 5.05kV; Current Rating: 1A; Number of Positions: 5; Gender: Male; Connector Type: Male Pin; Glow Wire Compliant: Non-compliant; Washability: OK; Supplier 1: Digi-Key; Supplier Part Number 1: WM7882CT-ND; Stock 1: 29165; Pricing 1: 1=0.66000, 10=0.62200, 100=0.47670, 500=0.41448 (USD); RoHS: Yes; Mount: Surface Mount; Color: Natural; Contact Plating: Tin; Contact Material: Bronze,Tin; Housing Color: Natural; Housing Material: Nylon; Min Operating Temperature: -40°C; Max Operating Temperature: 85°C; Package Quantity: 1100; Packaging: Tape and Reel; Number of Rows: 1; Voltage Rating (AC): 50V; Termination: Solder; Fastening Type: Detent; Number of Contacts: 5; Max Voltage Rating (AC): 50V; Contact Gender: Male; Orientation: Vertical; Number of Circuits: 5; Length: 7.24mm; Pitch: 1mm; Depth: 3.6mm; Radiation Hardening: No; REACH SVHC: Unknown; Lead Free: Lead Free; ComponentLink1URL: https://datasheet.ciiva.com/11748/0900766b80b0af91-11748006.pdf?src-supplier=RSComponents; ComponentLink1Description: https://datasheet.ciiva.com/11748/0900766b80b0af91-11748006.pdf?src-supplier=RSComponents; ComponentLink2URL: https://datasheet.ciiva.com/30169/101445013310507-pcb-headers-30169975.pdf?src-supplier=Onlinecomponents.com; ComponentLink2Description: https://datasheet.ciiva.com/30169/101445013310507-pcb-headers-30169975.pdf?src-supplier=Onlinecomponents.com; ComponentLink3URL: https://datasheet.ciiva.com/9469/5013310507-pcb-headers-9469065.pdf?src-supplier=Avnet; ComponentLink3Description: https://datasheet.ciiva.com/9469/5013310507-pcb-headers-9469065.pdf?src-supplier=Avnet; ComponentLink4URL: https://datasheet.ciiva.com/5156/5013310507-pcb-headers-179252-5156221.pdf?src-supplier=Mouser; ComponentLink4Description: https://datasheet.ciiva.com/5156/5013310507-pcb-headers-179252-5156221.pdf?src-supplier=Mouser; ComponentLink5URL: https://datasheet.ciiva.com/7683/1631871-7683719.pdf?src-supplier=Element14; ComponentLink5Description: https://datasheet.ciiva.com/7683/1631871-7683719.pdf?src-supplier=Element14
footprint CON-5POS-1MM-SMD
pins: 1, 2, 3, 4, 5, MP1, MP2

## CON-5POS-2.54MM-RA
designator J?  Pitch: 2.54mm  Mount: TH  (hidden comment: *)
CONN HEADER 5 POS 2.54MM; Manufacturer: Wurth Electronics; Manufacturer Part Number: 61300511121; Number of Positions: 5; Gender: Male; Connector Type: Male Pin; Washability: OK; Supplier 1: Digi-Key; Stock 1: 16154; Pricing 1: 1=0.25, 10=0.209, 25=0.174, 50=0.145, 100=0.132, 1000=0.12 (USD); Contact Plating: Gold; Contact Material: Copper; Colour: Black; Number of Rows: 1; Packaging: Bulk; Termination: Solder; Number of Contacts: 5; REACH SVHC: Unknown; Lead Free: Lead Free; Supplier Part Number 1: 732-5318-ND; Contact Mating Length: 0.236inch
footprint CON-1X5-RA
pins: 1 GND_IN, 2, 3, 4, 5

## CON-5POS-2.54MM-VERT
designator J?  Pitch: 2.54mm  Mount: TH  (hidden comment: *)
CONN HEADER 5 POS 2.54MM; Manufacturer: Wurth Electronics; Manufacturer Part Number: 61300511121; Number of Positions: 5; Gender: Male; Connector Type: Male Pin; Washability: OK; Supplier 1: Digi-Key; Stock 1: 16154; Pricing 1: 1=0.25, 10=0.209, 25=0.174, 50=0.145, 100=0.132, 1000=0.12 (USD); Contact Plating: Gold; Contact Material: Copper; Colour: Black; Number of Rows: 1; Packaging: Bulk; Termination: Solder; Number of Contacts: 5; REACH SVHC: Unknown; Lead Free: Lead Free; Supplier Part Number 1: 732-5318-ND; Contact Mating Length: 0.236inch
footprint CON-1X5-VERT
pins: 1 GND_IN, 2, 3, 4, 5

## CON-6POS-1MM27-VERT ERNI284698
designator J?, comment 284698
CONN WIRE TO BOARD M 6 POS 1.27MM SOLDER ST SMD; Manufacturer: ERNI; Gender: Male; Contact Resistance: 25mR; Current Rating: 2.8A; Supplier 1: Mouser; Manufacturer Part Number: 284698; Stock 1: 2326; Pricing 1: 1=2,93000, 10=2,69000, 25=2,57000, 100=2,32000, 250=2,08000, 650=1,96000 (USD); RoHS: Yes; Contact Plating: Gold; Contact Material: Copper Alloy,Gold; Housing Material: Polymer; Min Operating Temperature: -55°C; Max Operating Temperature: 125°C; Termination: Solder; Packaging: Tape and Reel; Orientation: Straight; Number of Rows: 1; Length: 12.7mm; Pitch: 1.27mm; Depth: 7mm; ComponentLink1URL: https://datasheet.ciiva.com/14153/qyerni-src-minibridge-e-14153863.pdf?src-supplier=Distrelec; ComponentLink1Description: https://datasheet.ciiva.com/14153/qyerni-src-minibridge-e-14153863.pdf?src-supplier=Distrelec; Supplier Part Number 1: 305-284698
footprint CON-6POS-1MM27-SMD-284698 (ERNI 284698)
pins: 1 GND_IN, 2, 3, 4, 5, 6, MP1 MP, MP2 MP, MP3 MP, MP4 MP

## CON-6POS-2.5MM-HOUSİNG
designator J?  Gender: RCP  Pitch: 2.5mm  (hidden comment: *)
CONN HOUSING 6POS 2.5MM SHROUD; Manufacturer: Molex; Number of Contacts: 6; Current Rating: 3A; Insulation Resistance: 1GR; Voltage Rating (AC): 250V; Connector Type: Power,Receptacle,Rectangular,Socket; Shrouded: Yes (With); Test Voltage: 1kV; Glow Wire Compliant: Non-compliant; Washability: OK; Supplier 1: Digi-Key; Manufacturer Part Number: 50-37-5063; Stock 1: 2670; Pricing 1: 1=0.48, 10=0.45, 25=0.4052, 50=0.36, 100=0.345, 250=0.315, 500=0.3, 1000=0.2475, 2500=0.225 (USD); Mount: Cable,Free Hanging,PCB; Housing Material: Polyamide; Material: Nylon,Polyamide; Min Operating Temperature: -40°C; Max Operating Temperature: 105°C; Orientation: Straight; Number of Rows: 1; Packaging: Bulk; Package Quantity: 10; Fastening Type: Ramp; Number of Poles: 6; Contact Gender: Female; Number of Positions: 6; Termination: Crimp; Working Voltage: 250V; Length: 17.4mm; Depth: 3.9mm; Width: 8mm; Radiation Hardening: No; REACH SVHC: Unknown; Lead Free: Lead Free; Halogen Free: Low Halogen; Flammability Rating: UL94 V-0; ComponentLink1URL: https://www.molex.com/pdm_docs/sd/050375063_sd.pdf; ComponentLink1Description: https://www.molex.com/pdm_docs/sd/050375063_sd.pdf; ComponentLink2URL: http://uk.rs-online.com/webdocs/13c3/0900766b813c31df.pdf; ComponentLink2Description: http://uk.rs-online.com/webdocs/13c3/0900766b813c31df.pdf; ComponentLink3URL: http://www.mouser.com/ds/2/276/0050375063_CRIMP_HOUSINGS-160457.pdf; ComponentLink3Description: http://www.mouser.com/ds/2/276/0050375063_CRIMP_HOUSINGS-160457.pdf; ComponentLink4URL: http://www.molex.com/webdocs/datasheets/pdf/en-us/0050375063_CRIMP_HOUSINGS.pdf; ComponentLink4Description: http://www.molex.com/webdocs/datasheets/pdf/en-us/0050375063_CRIMP_HOUSINGS.pdf; ComponentLink5URL: http://www.farnell.com/datasheets/2035859.pdf; ComponentLink5Description: http://www.farnell.com/datasheets/2035859.pdf; ComponentLink6URL: http://www.onlinecomponents.com/productFiles/mf-MOL/374960050375063_crimp_housings.pdf; ComponentLink6Description: http://www.onlinecomponents.com/productFiles/mf-MOL/374960050375063_crimp_housings.pdf; Supplier Part Number 1: WM18876-ND
pins: 1 GND_IN, 2, 3, 4, 5, 6

## CON-6POS-2.5MM-VERT
designator J?, comment Mount: TH  Pitch: 2.5mm  (hidden comment: 0022035065)
CONN HEADER 6POS 2.5MM VERT TIN; Manufacturer: Molex; Number of Contacts: 6; Contact Resistance: 20mR; Current Rating: 3A; Gender: Male; Voltage Rating: 250V; Connector Type: Male Pin; Insulation Resistance: 1GR; Test Voltage: 1kV; Glow Wire Compliant: Non-compliant; Washability: OK; Supplier 1: Digi-Key; Manufacturer Part Number: 22-03-5065; Stock 1: 17442; Pricing 1: 1=0.96, 10=0.842, 100=0.726, 500=0.594, 1000=0.528, 5000=0.462, 10000=0.4389 (USD); Contact Plating: Copper,Tin; Contact Material: Brass,Tin; Housing Material: Nylon; Material: Nylon,Polyamide; Min Operating Temperature: -40°C; Max Operating Temperature: 105°C; Number of Rows: 1; Termination: Solder; Packaging: Bulk; Number of Positions: 6; Voltage Rating (AC): 250V; Voltage Rating (DC): 250V; Number of Circuits: 6; Package Quantity: 1; Number of Poles: 6; Working Voltage: 250V; Contact Gender: Male; Lead Pitch: 2.5mm; Contact Mating Length: 0.138inch; Radiation Hardening: No; Lead Free: Lead Free; REACH SVHC: Unknown; ComponentLink1URL: https://www.molex.com/pdm_docs/sd/022035065_sd.pdf; ComponentLink1Description: https://www.molex.com/pdm_docs/sd/022035065_sd.pdf; ComponentLink2URL: http://uk.rs-online.com/webdocs/13c2/0900766b813c2d9e.pdf; ComponentLink2Description: http://uk.rs-online.com/webdocs/13c2/0900766b813c2d9e.pdf; ComponentLink3URL: http://www.farnell.com/datasheets/1865032.pdf; ComponentLink3Description: http://www.farnell.com/datasheets/1865032.pdf; ComponentLink4URL: http://www.molex.com/webdocs/datasheets/pdf/en-us/0022035065_PCB_HEADERS.pdf; ComponentLink4Description: http://www.molex.com/webdocs/datasheets/pdf/en-us/0022035065_PCB_HEADERS.pdf; ComponentLink5URL: http://www.farnell.com/datasheets/2035864.pdf; ComponentLink5Description: http://www.farnell.com/datasheets/2035864.pdf; ComponentLink6URL: http://www.mouser.com/ds/2/276/0022035065_PCB_HEADERS-158317.pdf; ComponentLink6Description: http://www.mouser.com/ds/2/276/0022035065_PCB_HEADERS-158317.pdf; Supplier Part Number 1: WM18890-ND; Orientation: VRT
footprint CON-6POS-2.5MM-VERT
pins: 1 GND_IN, 2, 3, 4, 5, 6

## CON-6POS-2.54MM
designator J?, comment 2.54MM
CONN RCPT 6POS 0.1 TIN PCB; Manufacturer 1: Harwin; Manufacturer Part Number: M20-7820646; Number of Contacts: 6; Gender: Female; Connector Type: Receptacle,Socket; Max Current Rating: 3A; Contact Resistance: 20mR; Supplier 1: Digi-Key; RoHS: Yes; Category: Headers and Wire Housings; Stock: 1847; Pricing: 1=0,96000, 10=0,84200, 100=0,72600, 500=0,59400, 1000=0,52800, 5000=0,46200, 10000=0,43890 (USD); Mount: Through Hole; Case/Package: SIL; Housing Material: Nylon; Color: Black; Contact Plating: Tin; Contact Material: Bronze; Housing Color: Black; Min Operating Temperature: -40°C; Max Operating Temperature: 105°C; Termination: Solder; Number of Rows: 1; Number of Positions: 6; Packaging: Rail/Tube; Orientation: Straight; Contact Gender: Female; Package Quantity: 38; Length: 15.64mm; Pitch: 2.54mm; Depth: 2.5mm; Radiation Hardening: No; ComponentLink1URL: http://components.arrow.com/part/dataview/0323_00725884?src-supplier=Arrow+Europe; ComponentLink1Description: http://components.arrow.com/part/dataview/0323_00725884?src-supplier=Arrow+Europe; ComponentLink2URL: http://www.harwin.com/include/downloads/pdfs/2010PAGE120.PDF?src-supplier=Avnet; ComponentLink2Description: http://www.harwin.com/include/downloads/pdfs/2010PAGE120.PDF?src-supplier=Avnet; ComponentLink3URL: https://cdn.harwin.com/pdfs/M20-782.pdf?src-supplier=Digi-Key; ComponentLink3Description: https://cdn.harwin.com/pdfs/M20-782.pdf?src-supplier=Digi-Key; ComponentLink4URL: https://cdn.harwin.com/pdfs/Harwin_PC_Connectors_M20.pdf?src-supplier=Avnet+Europe; ComponentLink4Description: https://cdn.harwin.com/pdfs/Harwin_PC_Connectors_M20.pdf?src-supplier=Avnet+Europe; ComponentLink5URL: https://cdn.harwin.com/pdfs/Harwin_PC_Connectors_M20.pdf?src-supplier=RSComponents; ComponentLink5Description: https://cdn.harwin.com/pdfs/Harwin_PC_Connectors_M20.pdf?src-supplier=RSComponents; ComponentLink6URL: https://cdn.harwin.com/pdfs/Harwin_PC_Connectors_M20.pdf?src-supplier=Mouser; ComponentLink6Description: https://cdn.harwin.com/pdfs/Harwin_PC_Connectors_M20.pdf?src-supplier=Mouser; ComponentLink7URL: https://cdn.harwin.com/pdfs/Harwin_PC_Connectors_M20.pdf?src-supplier=TTI; ComponentLink7Description: https://cdn.harwin.com/pdfs/Harwin_PC_Connectors_M20.pdf?src-supplier=TTI; Supplier Part Number 1: 952-1809-ND
footprint CON-1X6-VERT-2.54MM
pins: 1 GND_IN, 2, 3, 4, 5, 6

## CON-6POS-2.54MM-691402910006B
designator J?  Pitch: 2.54mm
2.54 MM TERMINAL BLOCK, HORIZONT; Manufacturer Part Number: 691402910006B; Compliance: RoHS; Modularity: No; PCB/Cable/Panel: PCB; Pin Number: 6; Rated Current [UL]: 6A; Working Voltage [UL]: 150VAC; Washability: OK; ComponentLink1Description: Manufacturer; ComponentLink1URL: http://www.we-online.de; ComponentLink2URL: https://katalog.we-online.de/em/datasheet/691402910006B.pdf; ComponentLink2Description: Datasheet; Mounting Technology: THT; Packaging: Box; Operating Temperature: -40 to +105degC; Published Date: October 2019; Type: Horizontal; Publisher: Wurth Elektronik; Application: Screwless
footprint CON-6POS-691402910006B (2.54 mm - Screwless Horizontal Entry - 06p)
pins: 1, 2, 3, 4, 5, 6

## CON-6POS-2MM
designator J?, comment 2MM
CONN HEADER VERT 6POS 2MM; Manufacturer: Sullins; Manufacturer Part Number: SWR201-NRTN-S06-SA-WH; Number of Positions: 6; Connector Type: Male Pin; Pitch: 0.079inch; Washability: OK; Supplier 1: Digi-Key; RoHS: Yes; Stock 1: 782; Pricing 1: 1 = 0,24000, 10 = 0,23000, 100 = 0,16100, 500 = 0,13798, 1000 = 0,11498, 5000 = 0,09855, 10000 = 0,09490 (USD); Mount: Through Hole; Color: White; Contact Plating: Tin; Package Quantity: 2000; Number of Rows: 1; Packaging: Bulk; Termination: Solder; Lead Free: Lead Free; ComponentLink1URL: https://media.digikey.com/PDF/Data%20Sheets/Sullins%20PDFs/SWR201-NRTN-Sxx-SA-WH.pdf?src-supplier=Digi-Key; ComponentLink1Description: https://media.digikey.com/PDF/Data%20Sheets/Sullins%20PDFs/SWR201-NRTN-Sxx-SA-WH.pdf?src-supplier=Digi-Key; Supplier Part Number 1: S9455-ND
footprint CON-4POS-2MM-VERT
pins: 1 GND_IN, 2, 3, 4, 5, 6

## CON-6POS-2MM-HEADER
designator J?, comment 6POS